# Altium footprint library Amirreza.PcbLib: 524 footprints (part 26 of 33)
Each footprint in its own frame and in the unit in brackets; x right, y up, seen from the top. Pads: shape width x height; smd on the part's side, far side on the other; paste and mask are expansions set on the pad; w line width, h text height; cw(c..) or ccw(c..) is an arc to the next point about the centre after c.
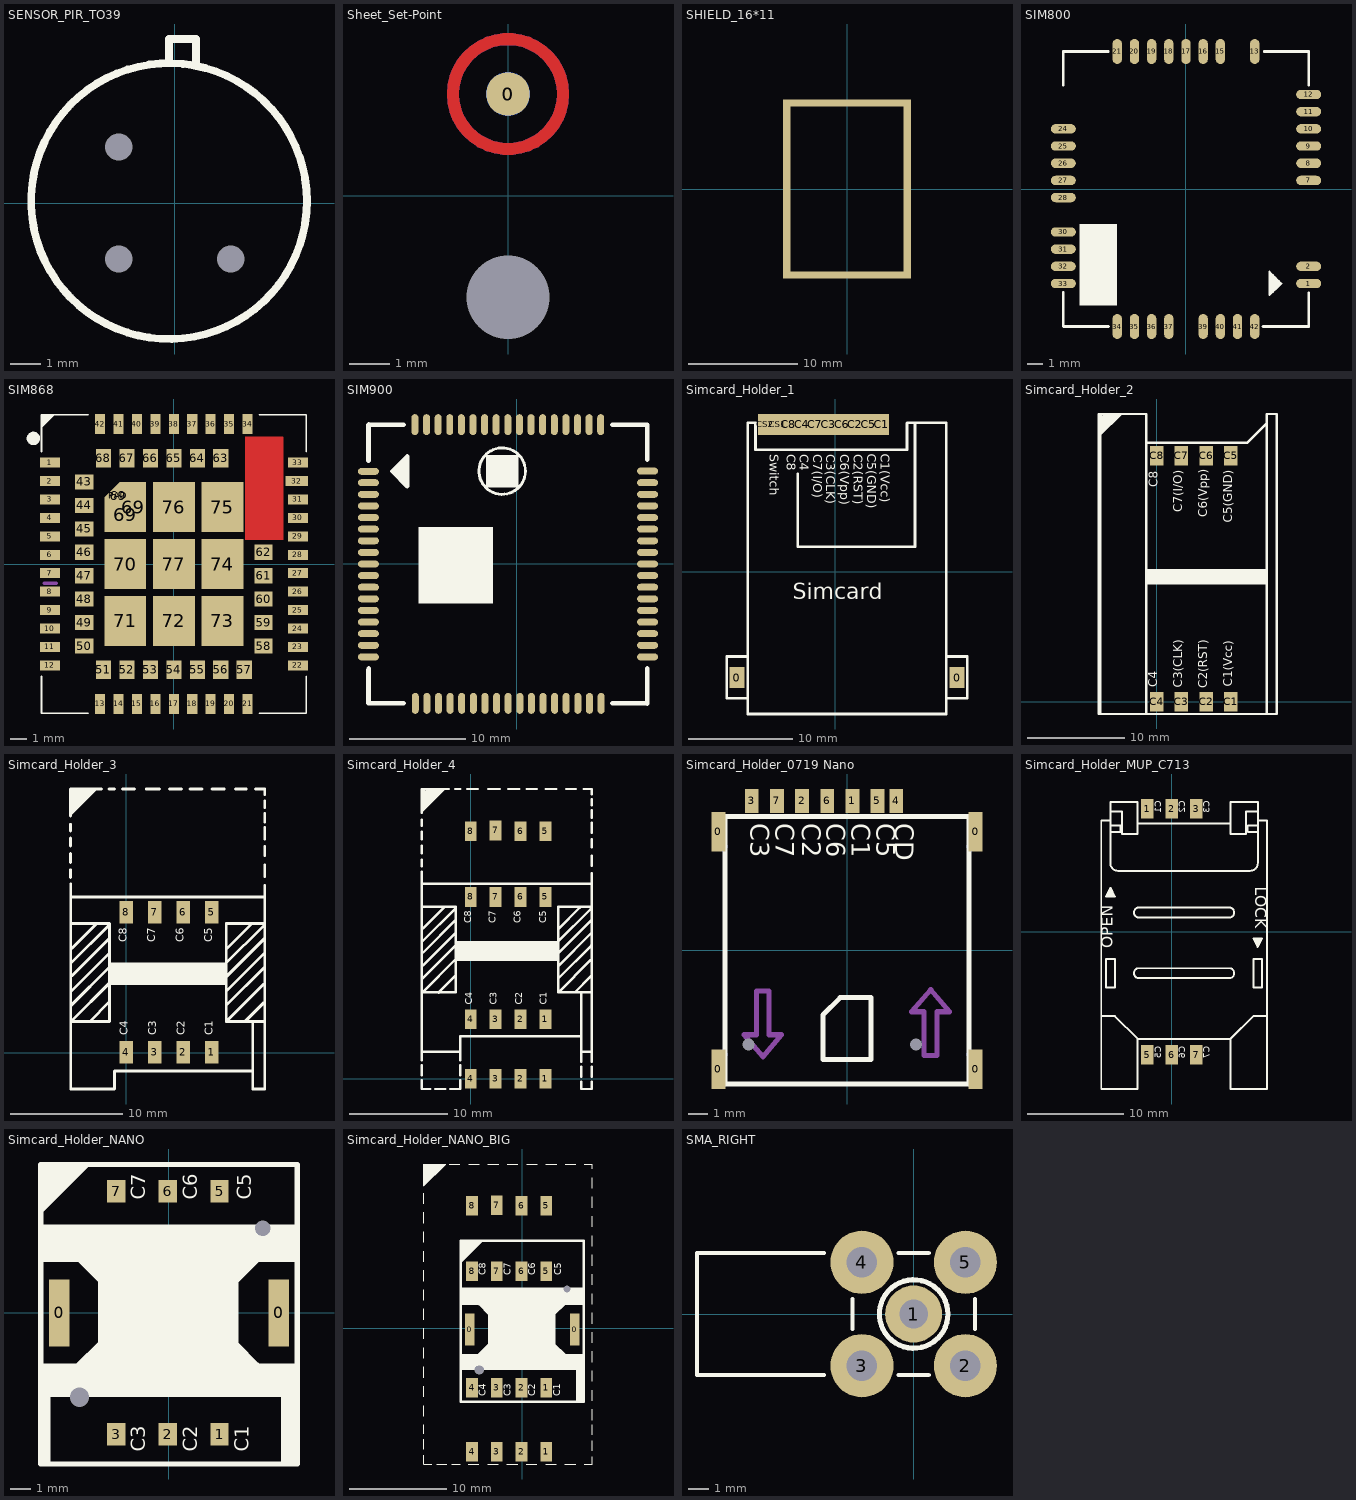
[diagram p25: the footprints below, top view; thin cyan lines are the x and y axes]

## SCRW_PANH_PHLIPS_M3X5 [mm] "SCREW, M3, 3.0mm diameter and 6.0mm PanHead, Phillips or Cross, 5mm Length"
3D body "Screw_M3x5.stp": height 2.28, standoff -5, extent -2.745,-2.745 2.745,2.745

## SENSOR_PIR_TO39 [mil]
pads (3):
  round 0 / inner round 0 / far side round 98.43 hole 35.43: 1(-72.5,72.5) 2(-72.5,-72.5) 3(72.5,-72.5)
Top Overlay:
  circle w10: c-7.5,2.5 r178.68
  lines w10: -7.5,182.5 -7.5,212.5 27.5,212.5 27.5,182.5
3D body "User Library-PIR_S_Orginal.step": height 187.04, standoff -76.74, extent -253.32,-253.33 253.34,253.34

## Sheet_Set-Point [mm]
pads (4):
  round 1.068 smd far side mask+0: 0(0,2.5)
  round 1.068 smd mask+0.65: 0(0,2.5)
  round 0 hole 2.05 paste-2539.97 mask-0.152: 1(0,-2.5)
  round 0 smd far side: 7(0.025,2.5)
Top Layer:
  circle w0.3: c0,2.5 r1.353
Bottom Layer:
  circle w0.3: c0,2.5 r1.353

## SHIELD_16*11 [mm]
pads (4):
  rect 0.65x16.4 smd: 1(-5.51,0) 1(5.51,0)
  rect 11.67x0.65 smd: 1(0,-7.875) 1(0,7.875)

## SIM800 [mm]
pads (33):
  oval 1.6x0.6 smd: 1(7.85,-6.05) 2(7.85,-4.95) 7(7.85,0.55) 8(7.85,1.65) 9(7.85,2.75) 10(7.85,3.85) 11(7.85,4.95) 12(7.85,6.05) 24(-7.85,3.85) 25(-7.85,2.75) 26(-7.85,1.65) 27(-7.85,0.55) 28(-7.85,-0.55) 30(-7.85,-2.75) 31(-7.85,-3.85) 32(-7.85,-4.95) 33(-7.85,-6.05)
  oval 0.6x1.6 smd: 13(4.4,8.8) 15(2.2,8.8) 16(1.1,8.8) 17(0,8.8) 18(-1.1,8.8) 19(-2.2,8.8) 20(-3.3,8.8) 21(-4.4,8.8) 34(-4.4,-8.8) 35(-3.3,-8.8) 36(-2.2,-8.8) 37(-1.1,-8.8) 39(1.1,-8.8) 40(2.2,-8.8) 41(3.3,-8.8) 42(4.4,-8.8)
Top Overlay:
  region: -4.415,-2.24 -6.803,-2.24 -6.803,-7.447 -4.415,-7.447
  lines w0.127: 5.412,-6.736 5.412,-5.364 ; 5.488,-6.66 5.488,-5.44 ; 5.564,-6.583 5.564,-5.517 ; 5.64,-6.507 5.64,-5.593 ; 5.716,-6.431 5.716,-5.669 ; 5.793,-6.355 5.793,-5.745 ; 5.869,-6.279 5.869,-5.821 ; 5.945,-6.202 5.945,-5.898 ; 6.021,-6.126 6.021,-5.974 ; 5.335,-6.787 6.097,-6.05 5.335,-5.288 5.335,-6.787
  lines w0.178: -7.85,-6.609 -7.85,-8.79 -7.84,-8.8 -4.952,-8.8 ; -7.85,6.65 -7.85,8.8 -4.977,8.8 ; 4.929,-8.8 7.85,-8.8 7.85,-6.634 ; 5.005,8.8 7.85,8.8 7.85,6.65
3D body "User Library-SIM800C-1.STEP": height 2.32, standoff -0.02, extent -7.85,-8.8 7.85,8.8

## SIM868 [mm]
pads (80):
  rect 1.2x0.6 smd mask+0.051: 1(-7.4,6.05) 2(-7.4,4.95) 3(-7.4,3.85) 4(-7.4,2.75) 5(-7.4,1.65) 6(-7.4,0.55) 7(-7.4,-0.55) 8(-7.4,-1.65) 9(-7.4,-2.75) 10(-7.4,-3.85) 11(-7.4,-4.95) 12(-7.4,-6.05) 22(7.4,-6.05) 23(7.4,-4.95) 24(7.4,-3.85) 25(7.4,-2.75) 26(7.4,-1.65) 27(7.4,-0.55) 28(7.4,0.55) 29(7.4,1.65) 30(7.4,2.75) 31(7.4,3.85) 33(7.4,6.05)
  rect 0.6x1.2 smd mask+0.051: 13(-4.4,-8.35) 14(-3.3,-8.35) 15(-2.2,-8.35) 16(-1.1,-8.35) 17(0,-8.35) 18(1.1,-8.35) 19(2.2,-8.35) 20(3.3,-8.35) 21(4.4,-8.35) 34(4.4,8.35) 35(3.3,8.35) 36(2.2,8.35) 37(1.1,8.35) 38(0,8.35) 39(-1.1,8.35) 40(-2.2,8.35) 41(-3.3,8.35) 42(-4.4,8.35)
  rect 1.35x0.6 smd paste+0.1 mask+0.051: 32(7.325,4.95)
  rect 1.1x0.9 smd paste-0.08 mask+0.051: 43(-5.35,4.9) 44(-5.35,3.5) 45(-5.35,2.1) 46(-5.35,0.7) 47(-5.35,-0.7) 48(-5.35,-2.1) 49(-5.35,-3.5) 50(-5.35,-4.9) 58(5.35,-4.9) 59(5.35,-3.5) 60(5.35,-2.1) 61(5.35,-0.7) 62(5.35,0.7)
  rect 0.9x1.1 smd paste-0.08 mask+0.051: 51(-4.2,-6.3) 52(-2.8,-6.3) 53(-1.4,-6.3) 54(0,-6.3) 55(1.4,-6.3) 56(2.8,-6.3) 57(4.2,-6.3) 63(2.8,6.3) 64(1.4,6.3) 65(0,6.3) 66(-1.4,6.3) 67(-2.8,6.3)
  rect 0.9x1.1 smd paste+0 mask+0.051: 68(-4.2,6.3)
  rect 1x1.2 smd rot 135 paste-10 mask+0.075: 69(-3.33,4.082)
  rect 2.5x2.07 smd paste-10 mask+0.075: 69(-2.9,2.935)
  rect 1.57x3 smd paste-10 mask+0.075: 69(-2.435,3.4)
  rect 2.5x3 smd paste-10 mask+0.075: 70(-2.9,0) 71(-2.9,-3.4) 72(0,-3.4) 73(2.9,-3.4) 74(2.9,0) 75(2.9,3.4) 76(0,3.4) 77(0,0)
  rect 1x1.32 smd rot 135 paste-10 mask+0: PAD(-3.33,4.082)
Top Layer:
  pour cut-out: 6.54,1.46 6.54,7.59 4.27,7.59 4.27,1.46
Top Overlay:
  circle w0.4: c-8.378,7.493 r0.2
  region: -7.9,8.1 -7.9,8.9 -7.1,8.9
  lines w0.1: -7.9,-6.7 -7.9,-8.9 -5.1,-8.9 ; -7.9,6.7 -7.9,8.9 -5.1,8.9 ; 5.1,-8.9 7.9,-8.9 7.9,-6.7 ; 5.1,8.9 7.9,8.9 7.9,6.7
Top Paste:
  region: -3.075,2.025 -3.075,3.225 -4.05,3.225 -4.05,2.025
  region: -1.75,2.025 -1.75,3.225 -2.725,3.225 -2.725,2.025
  region: -1.75,3.575 -1.75,4.775 -2.725,4.775 -2.725,3.575
  region: -3.075,-1.375 -3.075,-0.175 -4.05,-0.175 -4.05,-1.375
  region: -1.75,-1.375 -1.75,-0.175 -2.725,-0.175 -2.725,-1.375
  region: -1.75,0.175 -1.75,1.375 -2.725,1.375 -2.725,0.175
  region: -3.075,0.175 -3.075,1.375 -4.05,1.375 -4.05,0.175
  region: -0.175,2.025 -0.175,3.225 -1.15,3.225 -1.15,2.025
  region: 1.15,2.025 1.15,3.225 0.175,3.225 0.175,2.025
  region: 1.15,3.575 1.15,4.775 0.175,4.775 0.175,3.575
  region: -0.175,3.575 -0.175,4.775 -1.15,4.775 -1.15,3.575
  region: -0.175,-1.375 -0.175,-0.175 -1.15,-0.175 -1.15,-1.375
  region: 1.15,-1.375 1.15,-0.175 0.175,-0.175 0.175,-1.375
  region: 1.15,0.175 1.15,1.375 0.175,1.375 0.175,0.175
  region: -0.175,0.175 -0.175,1.375 -1.15,1.375 -1.15,0.175
  region: 2.725,2.025 2.725,3.225 1.75,3.225 1.75,2.025
  region: 4.075,2.025 4.075,3.225 3.1,3.225 3.1,2.025
  region: 4.075,3.575 4.075,4.775 3.1,4.775 3.1,3.575
  region: 2.725,3.575 2.725,4.775 1.75,4.775 1.75,3.575
  region: 2.725,-1.375 2.725,-0.175 1.75,-0.175 1.75,-1.375
  region: 4.075,-1.375 4.075,-0.175 3.1,-0.175 3.1,-1.375
  region: 4.075,0.175 4.075,1.375 3.1,1.375 3.1,0.175
  region: 2.725,0.175 2.725,1.375 1.75,1.375 1.75,0.175
  region: 2.725,-4.775 2.725,-3.575 1.75,-3.575 1.75,-4.775
  region: 4.075,-4.775 4.075,-3.575 3.1,-3.575 3.1,-4.775
  region: 4.075,-3.225 4.075,-2.025 3.1,-2.025 3.1,-3.225
  region: 2.725,-3.225 2.725,-2.025 1.75,-2.025 1.75,-3.225
  region: -0.175,-4.775 -0.175,-3.575 -1.15,-3.575 -1.15,-4.775
  region: 1.15,-4.775 1.15,-3.575 0.175,-3.575 0.175,-4.775
  region: 1.15,-3.225 1.15,-2.025 0.175,-2.025 0.175,-3.225
  region: -0.175,-3.225 -0.175,-2.025 -1.15,-2.025 -1.15,-3.225
  region: -3.075,-3.225 -3.075,-2.025 -4.05,-2.025 -4.05,-3.225
  region: -1.75,-3.225 -1.75,-2.025 -2.725,-2.025 -2.725,-3.225
  region: -1.75,-4.775 -1.75,-3.575 -2.725,-3.575 -2.725,-4.775
  region: -3.075,-4.775 -3.075,-3.575 -4.05,-3.575 -4.05,-4.775
  region: -3.075,3.575 -4.05,3.575 -4.05,3.875 -3.175,4.75 -3.075,4.75
Mechanical 2:
  lines w0.203: -7.748,-1.142 -7.003,-1.142
3D body "User Library-SIM868-1 (2).step": height 2.5, standoff 0, extent -7.85,-8.8 7.85,8.8

## SIM900 [mm]
pads (68):
  oval 1.8x0.6 smd mask+0.102: 1(-12.778,7.974) 2(-12.778,6.993) 3(-12.778,5.993) 4(-12.778,4.993) 5(-12.778,3.993) 6(-12.778,2.993) 7(-12.778,1.993) 8(-12.778,0.993) 9(-12.778,-0.007) 10(-12.778,-1.007) 11(-12.778,-2.007) 12(-12.778,-3.007) 13(-12.778,-4.007) 14(-12.778,-5.007) 15(-12.778,-6.007) 16(-12.778,-7.007) 17(-12.778,-8.007) 35(11.254,-8.007) 36(11.254,-7.007) 37(11.254,-6.007) 38(11.254,-5.007) 39(11.254,-4.007) 40(11.254,-3.007) 41(11.254,-2.007) 42(11.254,-1.007) 43(11.254,-0.007) 44(11.254,0.993) 45(11.254,1.987) 46(11.254,2.993) 47(11.254,3.993) 48(11.254,4.993) 49(11.254,5.993) 50(11.254,6.993) 51(11.254,7.993)
  oval 0.6x1.8 smd mask+0.102: 18(-8.747,-12.007) 19(-7.746,-12.007) 20(-6.747,-12.007) 21(-5.747,-12.007) 22(-4.747,-12.007) 23(-3.746,-12.007) 24(-2.746,-12.007) 25(-1.747,-12.007) 26(-0.747,-12.007) 27(0.253,-12.007) 28(1.254,-12.007) 29(2.253,-12.007) 30(3.253,-12.007) 31(4.248,-12.007) 32(5.253,-12.007) 33(6.254,-12.007) 34(7.254,-12.007) 52(7.222,11.993) 53(6.222,11.993) 54(5.222,11.993) 55(4.222,11.993) 56(3.222,11.993) 57(2.222,11.993) 58(1.222,11.993) 59(0.222,11.993) 60(-0.778,11.993) 61(-1.778,11.993) 62(-2.778,11.993) 63(-3.778,11.993) 64(-4.778,11.993) 65(-5.778,11.993) 66(-6.778,11.993) 67(-7.778,11.993) 68(-8.778,11.993)
Top Layer:
  lines w0.4: 11.238,-0.991 11.254,-1.007
Top Overlay:
  circle w0.254: c-1.262,7.993 r2
  rectangle: -2.662,6.593 0.138,9.393
  rectangle: -8.462,-3.407 -2.062,3.193
  lines w0.4: -12.778,-9.107 -12.778,-12.007 -9.762,-12.007 ; -12.778,8.893 -12.778,11.993 -9.762,11.993 -12.746,11.993 ; -12.762,-11.991 -12.762,-9.007 ; -12.762,8.993 -12.762,12.009 ; -10.195,7.467 -10.195,8.433 ; -9.808,7.092 -9.808,8.87 ; -9.433,7.975 -10.703,7.975 ; 8.238,-12.007 11.222,-12.007 11.222,-9.107 ; 11.222,9.093 11.222,11.993 ; 11.238,-12.022 11.238,-9.007 ; 11.238,8.993 11.238,11.959 11.203,11.993 ; -10.703,7.975 -9.433,9.245 -9.433,6.705 -10.703,7.975 ; 11.203,11.993 8.238,11.993 11.204,11.993 ; -8.047,-2.807 -8.047,2.793 -2.447,2.793 -2.447,-2.807 -8.047,-2.807

## Simcard_Holder_1 [mm]
pads (12):
  rect 1.4x2 smd: 0(-9.407,-10.114) 0(11.643,-10.114) C1(4.449,14.111) C2(1.909,14.111) C3(-0.621,14.111) C4(-3.171,14.111) C5(3.179,14.111) C6(0.651,14.111) C7(-1.901,14.111) C8(-4.441,14.111) CS1(-5.512,14.111) CS2(-6.712,14.111)
Top Overlay:
  lines w0.254: -8.382,-12.089 -10.382,-12.089 -10.382,-8.089 -8.382,-8.089 ; -3.582,9.384 -3.582,2.411 7.618,2.411 7.618,5.911 ; 6.851,14.244 6.851,11.684 -7.632,11.684 -7.632,14.261 -8.382,14.261 -8.382,-13.589 10.618,-13.589 10.618,14.261 6.868,14.261 ; 7.618,5.411 7.618,14.261 ; 10.618,-12.089 12.618,-12.089 12.618,-8.089 10.618,-8.089
  text "Switch" at -6.589,11.259 h1.52
  text "C8" at -4.989,11.284 h1.52
  text "C1(Vcc)" at 4.018,11.311 h1.52
  text "C5(GND)" at 2.718,11.286 h1.52
  text "C2(RST)" at 1.411,11.284 h1.52
  text "C6(Vpp)" at 0.136,11.284 h1.52
  text "C3(CLK)" at -1.189,11.284 h1.52
  text "C7(I/O)" at -2.464,11.284 h1.52
  text "C4" at -3.739,11.284 h1.52
  text "Simcard" at -4.082,-2.589 h1.52

## Simcard_Holder_2 [mm]
pads (8):
  rect 1.4x2 smd: C1(7.62,0) C2(5.08,0) C3(2.54,0) C4(0,0) C5(7.62,25.22) C6(5.08,25.22) C7(2.54,25.22) C8(0,25.22)
Top Overlay:
  rectangle: -1.067,12 11.278,13.62
  region: -5.763,27.765 -4.153,29.346 -4.394,29.591 -6.004,28.01
  region: -5.823,29.071 -5.539,29.349 -5.78,29.595 -6.064,29.316
  region: -5.817,28.683 -5.143,29.346 -5.383,29.591 -6.058,28.928
  region: -5.835,28.346 -4.826,29.337 -5.067,29.582 -6.076,28.591
  region: -5.787,28.069 -4.47,29.362 -4.711,29.608 -6.028,28.314
  region: -5.805,27.426 -3.876,29.322 -4.117,29.567 -6.046,27.672
  lines w0.254: -5.761,-1.219 -5.761,27.437 -3.721,29.477 ; -1.067,-1.27 -1.067,29.515 -5.96,29.515 -5.96,-1.27 12.34,-1.27 12.34,29.515 11.278,29.515 11.278,-1.27 ; -1.067,26.543 9.271,26.543 11.278,28.55 ; -5.96,26.568 -5.96,26.568
  text "C4" at 0.356,1.499 h1.52
  text "C7(I/O)" at 2.946,19.431 h1.52
  text "C3(CLK)" at 2.921,1.448 h1.52
  text "C6(Vpp)" at 5.512,18.923 h1.52
  text "C2(RST)" at 5.512,1.372 h1.52
  text "C5(GND)" at 8.052,18.364 h1.52
  text "C1(Vcc)" at 8.052,1.524 h1.52
  text "C8" at 0.432,22.022 h1.52

## Simcard_Holder_3 [mm]
pads (8):
  rect 1.2x2 smd: 1(7.62,0.058) 2(5.08,0.058) 3(2.54,0.058) 4(0,0.058) 5(7.62,12.527) 6(5.08,12.527) 7(2.54,12.527) 8(0,12.527)
Top Overlay:
  rectangle: -1.499,6.027 8.915,8.027
  region: -4.84,21.435 -2.911,23.331 -3.152,23.576 -5.081,21.681
  region: -4.822,22.078 -3.505,23.371 -3.746,23.617 -5.063,22.323
  region: -4.869,22.355 -3.861,23.346 -4.102,23.591 -5.11,22.6
  region: -4.852,22.692 -4.177,23.355 -4.418,23.6 -5.093,22.937
  region: -4.858,23.08 -4.574,23.358 -4.815,23.604 -5.099,23.325
  region: -4.797,21.774 -3.188,23.355 -3.429,23.6 -5.038,22.019
  lines w0.254: -4.975,23.527 -2.21,23.527 ; -4.969,15.633 -4.969,16.319 ; -4.969,16.98 -4.969,17.767 ; -4.969,18.427 -4.969,19.164 ; -4.969,19.774 -4.969,20.383 ; -4.969,21.12 -4.969,23.527 ; -4.96,15.075 -4.96,13.897 ; -4.936,7.996 -1.562,11.37 ; -4.936,21.306 -2.756,23.486 ; -4.928,2.797 -1.499,2.797 -1.499,11.535 -4.877,11.535 ; -4.91,4.237 -1.499,7.649 ; -4.86,2.865 -1.575,6.15 ; -4.86,5.558 -1.511,8.906 ; -4.86,9.317 -2.68,11.497 ; -4.834,6.879 -1.499,10.214 ; -3.259,2.789 -1.537,4.512 ; -1.549,23.527 -1.067,23.527 ; -1.067,-3.235 -1.067,-1.642 11.278,-1.642 ; -1.067,-3.232 -4.96,-3.232 -4.96,13.897 ; -0.356,23.527 0.711,23.527 ; 1.778,23.527 2.946,23.527 ; 3.835,23.527 4.928,23.527 ; 5.69,23.527 6.756,23.527 ; 7.645,23.527 8.738,23.527 ; 8.856,7.945 12.23,11.319 ; 8.933,2.815 12.217,6.099 ; 8.933,5.507 12.281,8.855 ; 8.933,9.266 11.112,11.446 ; 8.941,4.245 12.294,7.598 ; 8.958,6.828 12.294,10.163 ; 9.728,23.527 10.693,23.527 ; 10.604,2.81 12.255,4.461 ; 11.278,2.797 11.278,-3.232 12.34,-3.232 12.34,13.897 ; 11.532,23.527 12.319,23.527 ; 12.294,11.535 8.915,11.535 8.915,2.797 12.34,2.797 ; 12.34,14.943 12.34,13.897 ; 12.34,15.73 12.34,16.746 ; 12.34,17.585 12.34,18.397 ; 12.34,19.058 12.34,20.099 ; 12.34,20.582 12.34,21.344 ; 12.34,21.852 12.34,22.461 ; 12.34,23.016 12.34,23.527 ; -4.96,13.897 12.34,13.897
  text "C2" at 5.498,1.544 h1.2
  text "C1" at 7.987,1.544 h1.2
  text "C3" at 2.932,1.544 h1.2
  text "C4" at 0.392,1.544 h1.2
  text "C5" at 7.936,9.862 h1.2
  text "C6" at 5.371,9.868 h1.2
  text "C7" at 2.831,9.868 h1.2
  text "C8" at 0.291,9.865 h1.2

## Simcard_Holder_4 [mm]
pads (16):
  rect 1.2x2 smd: 1(7.62,0) 1(7.62,6.053) 2(5.08,0) 2(5.08,6.053) 3(2.54,0) 3(2.54,6.053) 4(0,0) 4(0,6.053) 5(7.62,18.522) 5(7.62,25.22) 6(5.08,18.522) 6(5.08,25.22) 7(2.54,18.522) 7(2.54,25.298) 8(0,18.522) 8(0,25.22)
Top Overlay:
  region: -4.797,27.768 -3.188,29.349 -3.429,29.594 -5.038,28.013
  region: -4.858,29.074 -4.574,29.353 -4.815,29.598 -5.099,29.319
  region: -4.852,28.687 -4.177,29.349 -4.418,29.594 -5.093,28.932
  region: -4.869,28.349 -3.861,29.34 -4.102,29.586 -5.11,28.594
  region: -4.822,28.072 -3.505,29.366 -3.746,29.611 -5.063,28.317
  region: -4.84,27.43 -2.911,29.325 -3.152,29.57 -5.081,27.675
  rectangle: -1.499,12.022 8.915,14.022
  lines w0.254: -4.975,29.522 -2.21,29.522 ; -4.969,21.628 -4.969,22.314 ; -4.969,22.974 -4.969,23.761 ; -4.969,24.422 -4.969,25.158 ; -4.969,25.768 -4.969,26.378 ; -4.969,27.114 -4.969,29.522 ; -4.96,-0.159 -4.96,-1.041 -4.115,-1.041 ; -4.96,0.349 -4.96,1.365 ; -4.96,1.873 -4.96,2.763 ; -4.96,21.069 -4.96,19.892 ; -4.936,13.991 -1.562,17.364 ; -4.936,27.3 -2.756,29.48 ; -4.928,8.792 -1.499,8.792 -1.499,17.529 -4.877,17.529 ; -4.91,10.231 -1.499,13.643 ; -4.86,8.86 -1.575,12.145 ; -4.86,11.552 -1.511,14.9 ; -4.86,15.311 -2.68,17.491 ; -4.834,12.873 -1.499,16.209 ; -3.607,-1.041 -2.591,-1.041 ; -3.259,8.784 -1.537,10.506 ; -2.083,-1.041 -1.067,-1.041 -1.067,-0.159 ; -1.549,29.522 -1.067,29.522 ; -1.067,0.349 -1.067,1.365 ; -1.067,1.873 -1.067,2.763 -4.96,2.763 ; -1.067,2.759 -1.067,4.352 11.278,4.352 ; -0.356,29.522 0.711,29.522 ; 1.778,29.522 2.946,29.522 ; 3.835,29.522 4.928,29.522 ; 5.69,29.522 6.756,29.522 ; 7.645,29.522 8.738,29.522 ; 8.856,13.94 12.23,17.313 ; 8.933,8.809 12.217,12.094 ; 8.933,11.501 12.281,14.85 ; 8.933,15.261 11.112,17.44 ; 8.941,10.24 12.294,13.592 ; 8.958,12.822 12.294,16.158 ; 9.728,29.522 10.693,29.522 ; 10.604,8.804 12.255,10.455 ; 11.278,-0.285 11.278,-1.041 12.34,-1.041 12.34,-0.285 ; 11.278,0.223 11.278,1.239 ; 11.278,1.747 11.278,2.763 ; 11.278,8.792 11.278,2.763 ; 11.532,29.522 12.319,29.522 ; 12.294,17.529 8.915,17.529 8.915,8.792 12.34,8.792 ; 12.34,0.223 12.34,1.239 ; 12.34,1.747 12.34,2.763 ; 12.34,20.937 12.34,19.892 ; 12.34,21.725 12.34,22.741 ; 12.34,23.579 12.34,24.392 ; 12.34,25.052 12.34,26.094 ; 12.34,26.576 12.34,27.338 ; 12.34,27.846 12.34,28.456 ; 12.34,29.01 12.34,29.522 ; -4.96,2.763 -4.96,19.892 ; -4.96,19.892 12.34,19.892 ; 11.278,2.763 12.34,2.763 ; 12.34,2.763 12.34,19.892
  text "C8" at 0.291,15.86 h1.2
  text "C7" at 2.831,15.862 h1.2
  text "C6" at 5.371,15.862 h1.2
  text "C5" at 7.936,15.856 h1.2
  text "C4" at 0.392,7.539 h1.2
  text "C3" at 2.932,7.539 h1.2
  text "C1" at 7.987,7.539 h1.2
  text "C2" at 5.498,7.539 h1.2

## Simcard_Holder_0719 Nano [mm] "Nano-SIM Card Holder Push-push Type 7PIN-0719-1.35"
pads (13):
  rect 0.7x2 smd: 0(-6.498,-6) 0(-6.498,6) 0(6.498,-6) 0(6.498,6)
  rect 0.7x1.2 smd: 1(0.27,7.55) 2(-2.27,7.55) 3(-4.81,7.55) 4(2.49,7.55) 5(1.54,7.55) 6(-1,7.55) 7(-3.54,7.55)
  round 0 hole 0.6 unplated: ""(-4.98,-4.75) ""(3.49,-4.75)
Top Overlay:
  lines w0.254: -6.15,-6.75 -6.15,6.75 6.15,6.75 6.15,-6.75 -6.15,-6.75 ; -1.219,-5.512 1.206,-5.512 1.206,-2.388 -0.343,-2.388 -1.219,-3.264 -1.219,-5.512
  text "C2" at -2.594,6.433 h1.6
  text "C1" at -0.079,6.433 h1.6
  text "C3" at -5.185,6.433 h1.6
  text "C5" at 1.168,6.433 h1.6
  text "C6" at -1.349,6.433 h1.6
  text "C7" at -3.915,6.433 h1.6
  text "CD" at 2.118,6.433 h1.6
Mechanical 13:
  region: 6.53,6.75 6.15,6.75 6.15,5.25 6.53,5.25
  rectangle: -6.53,5.25 -6.15,6.75
  rectangle: -6.53,-6.75 -6.15,-5.25
  region: 6.53,-5.25 6.15,-5.25 6.15,-6.75 6.53,-6.75
  lines w0.254: -6.15,-6.75 -6.53,-6.75 -6.53,-5.25 -6.15,-5.25 ; -6.15,5.25 -6.53,5.25 -6.53,6.75 -6.15,6.75 ; 6.15,-6.75 6.53,-6.75 6.53,-5.25 6.15,-5.25 ; 6.15,5.25 6.53,5.25 6.53,6.75 6.15,6.75 ; -5.207,-4.261 -4.572,-4.261 -4.572,-2.051 -3.937,-2.051 -3.937,-4.261 -3.302,-4.261 -4.242,-5.379 -5.207,-4.261 ; 3.264,-3.099 3.899,-3.099 3.899,-5.309 4.534,-5.309 4.534,-3.099 5.169,-3.099 4.229,-1.981 3.264,-3.099
Mechanical 29:
  text "EJECT" at -2.267,-4.804 h1.2
  text "INSERT" at 2.761,-4.804 h1.2
3D body "xb-xknano-113.stp": height 1.37, standoff -0.4, extent -6.549,-6.823 6.541,7.757

## Simcard_Holder_MUP_C713 [mm]
pads (6):
  rect 1.3x2 smd: 1(-2.54,12.77) 2(0,12.77) 3(2.54,12.77) 5(-2.54,-12.77) 6(0,-12.77) 7(2.54,-12.77)
Top Overlay:
  region: 8.913,-1.587 9.362,-0.689 8.464,-0.689
  region: -6.373,4.576 -6.822,3.678 -5.924,3.678
  lines w0.203: -7.33,-8.749 -5.924,-8.749 -3.552,-11.121 ; -6.386,10.383 -5.344,10.383 -5.344,11.058 -6.386,11.058 ; -6.386,12.507 -5.161,12.507 -5.161,10.139 -3.552,10.139 -3.552,11.25 ; 8.926,10.383 7.884,10.383 7.884,11.058 8.926,11.058 ; 8.926,12.507 7.701,12.507 7.701,10.139 6.092,10.139 6.092,11.25 ; 9.87,-8.749 8.464,-8.749 6.092,-11.121 ; -6.386,11.555 -6.386,13.46 -3.552,13.46 -3.552,11.25 ; -6.386,11.555 -7.33,11.555 -7.33,-16.323 -3.552,-16.323 -3.552,-11.121 ; -6.386,11.555 -6.386,7.125 ccw(c-5.598,7.125) -5.598,6.337 8.138,6.337 ccw(c8.138,7.125) 8.926,7.125 8.926,11.555 ; -3.552,-11.121 6.092,-11.121 ; -3.552,11.25 6.092,11.25 ; 6.092,-11.121 6.092,-16.323 9.87,-16.323 9.87,11.555 8.926,11.555 ; 6.092,11.25 6.092,13.46 8.926,13.46 8.926,11.555 ; -6.822,-5.782 -6.822,-2.803 -5.924,-2.803 -5.924,-5.782 -6.822,-5.782 ; -6.822,3.678 -6.373,4.576 -5.924,3.678 -6.822,3.678 ; -3.552,-4.8 cw(c-3.41,-4.292) -3.552,-3.784 6.092,-3.784 cw(c5.95,-4.292) 6.092,-4.8 -3.552,-4.8 ; -3.552,1.492 cw(c-3.41,2) -3.552,2.508 6.092,2.508 cw(c5.95,2) 6.092,1.492 -3.552,1.492 ; 8.464,-5.782 8.464,-2.803 9.362,-2.803 9.362,-5.782 8.464,-5.782 ; 8.464,-0.689 8.913,-1.587 9.362,-0.689 8.464,-0.689
  text "LOCK" at 8.272,4.662 h2
  text "OPEN" at -5.732,-1.723 h2
  text "C7" at 4.216,-11.908 h1.2
  text "C6" at 1.676,-11.908 h1.2
  text "C5" at -0.864,-11.908 h1.2
  text "C3" at 4.216,13.632 h1.2
  text "C2" at 1.676,13.632 h1.2
  text "C1" at -0.864,13.632 h1.2
3D body "User Library-SIM holder 115B-AAA0-R.step": height 2.4, standoff -0.65, extent -7.33,-16.425 9.87,13.275

## Simcard_Holder_NANO [mm]
pads (10):
  rect 1x3.29 smd: 0(-5.385,-0.005) 0(5.385,-0.005)
  round 0 hole 0.95: 0(-4.395,-4.155)
  round 0 hole 0.75: 0(4.605,4.145)
  rect 0.9x1.1 smd: 1(2.485,-5.975) 2(-0.055,-5.975) 3(-2.595,-5.975) 5(2.485,5.975) 6(-0.055,5.975) 7(-2.595,5.975)
Top Overlay:
  rectangle: 5.512,-7.433 6.303,-3.75
  rectangle: -6.304,-7.433 -5.821,-3.877
  region: 2.967,2.169 3.456,1.717 4.364,2.702 3.875,3.153
  region: 3.247,-1.59 2.796,-2.079 3.78,-2.988 4.232,-2.499
  region: -4.297,-2.505 -3.852,-2.95 -3.044,-2.141 -3.489,-1.697
  region: -3.915,3.16 -4.439,2.592 -3.455,1.684 -2.931,2.251
  rectangle: -6.278,-4.131 6.303,-2.505
  rectangle: -6.278,2.499 6.303,4.327
  rectangle: -3.484,-3.039 3.425,2.753
  region: -6.3,7.305 -6.3,4.845 -3.841,7.305
  lines w0.254: -4.538,-2.67 -3.332,-1.464 -3.332,-0.6 ; -4.398,2.854 -4.398,2.6 -3.332,1.533 -3.332,0.746 ; -1.966,7.28 -6.303,7.28 -6.303,-7.433 6.303,-7.433 6.303,7.28 -1.958,7.28 ; 3.298,-0.753 3.298,-1.54 4.339,-2.581 ; 3.298,0.416 3.298,1.559 4.377,2.638 4.377,2.842
  text "C7" at -0.919,5.538 h1.2
  text "C6" at 1.621,5.538 h1.2
  text "C5" at 4.288,5.538 h1.2
  text "C3" at -0.919,-6.837 h1.2
  text "C1" at 4.161,-6.837 h1.2
  text "C2" at 1.621,-6.837 h1.2
3D body "User Library-nano sim.step": height 1.45, standoff 0.1, extent -5.03,-6.185 5.37,6.115

## Simcard_Holder_NANO_BIG [mm]
pads (20):
  rect 1x3.29 smd: 0(-5.385,-0.107) 0(5.385,-0.107)
  round 0 hole 0.95: 0(-4.395,-4.257)
  round 0 hole 0.75: 0(4.605,4.043)
  rect 1.2x2 smd: 1(2.485,-12.649) 1(2.485,-6.077) 2(-0.055,-12.649) 2(-0.055,-6.077) 3(-2.595,-12.649) 3(-2.595,-6.077) 4(-5.135,-12.649) 4(-5.135,-6.077) 5(2.485,5.873) 5(2.485,12.571) 6(-0.055,5.873) 6(-0.055,12.571) 7(-2.595,5.873) 7(-2.595,12.649) 8(-5.135,5.873) 8(-5.135,12.571)
Top Overlay:
  rectangle: -3.484,-3.141 3.425,2.65
  rectangle: -6.278,2.396 6.303,4.225
  rectangle: -6.278,-4.233 6.303,-2.608
  region: -3.915,3.057 -4.439,2.49 -3.455,1.581 -2.931,2.149
  region: -4.297,-2.608 -3.852,-3.052 -3.044,-2.244 -3.489,-1.799
  region: 3.247,-1.693 2.796,-2.182 3.78,-3.09 4.232,-2.601
  region: 2.967,2.066 3.456,1.615 4.364,2.599 3.875,3.051
  rectangle: 5.512,-7.535 6.303,-3.852
  region: -4.119,9.017 -6.303,6.833 -6.303,9.017
  region: -7.92,16.873 -10.104,14.688 -10.104,16.873
  lines w0.127: -10.095,-13.018 -10.095,-13.9 -9.25,-13.9 ; -10.095,-12.401 -10.095,-11.385 ; -10.095,-10.777 -10.095,-9.887 ; -10.095,-8.998 -10.095,-7.905 ; -10.095,-7.016 -10.095,-5.924 ; -10.095,-5.035 -10.095,-3.943 ; -10.095,-3.054 -10.095,-1.962 ; -10.095,-1.073 -10.095,0.019 ; -10.095,0.908 -10.095,2.001 ; -10.095,2.89 -10.095,3.982 ; -10.095,4.871 -10.095,5.963 ; -10.095,6.852 -10.095,7.944 ; -10.095,8.833 -10.095,9.925 ; -10.095,10.814 -10.095,11.907 ; -10.095,12.796 -10.095,13.888 ; -8.742,-13.9 -7.726,-13.9 ; -7.472,16.873 -6.38,16.873 ; -7.218,-13.9 -6.367,-13.9 ; -5.521,-13.9 -4.429,-13.9 ; -5.491,16.873 -4.398,16.873 ; -3.54,-13.9 -2.447,-13.9 ; -3.509,16.873 -2.417,16.873 ; -1.558,-13.9 -0.466,-13.9 ; -1.528,16.873 -0.436,16.873 ; 0.423,-13.9 1.515,-13.9 ; 0.453,16.873 1.545,16.873 ; 2.404,-13.9 3.496,-13.9 ; 2.434,16.873 3.526,16.873 ; 4.385,-13.9 5.477,-13.9 ; 4.415,16.873 5.508,16.873 ; 6.366,-13.9 7.205,-13.9 7.205,-13.144 ; 6.397,16.873 7.184,16.873 ; 7.205,-12.527 7.205,-11.511 ; 7.205,-10.903 7.205,-9.887 ; 7.205,-9.395 7.205,-8.302 ; 7.205,-7.413 7.205,-6.321 ; 7.205,-5.432 7.205,-4.34 ; 7.205,-3.451 7.205,-2.359 ; 7.205,-1.47 7.205,-0.378 ; 7.205,0.511 7.205,1.604 ; 7.205,2.493 7.205,3.585 ; 7.205,4.474 7.205,5.566 ; 7.205,6.455 7.205,7.547 ; 7.205,8.436 7.205,9.528 ; 7.205,10.417 7.205,11.51 ; 7.205,12.399 7.205,13.491 ; 7.205,14.38 7.205,15.472 ; 7.205,16.361 7.205,16.873 ; -10.104,14.617 -7.849,16.873 -10.104,16.873 -10.104,14.617
  lines w0.254: -4.538,-2.773 -3.332,-1.566 -3.332,-0.703 ; -4.398,2.752 -4.398,2.498 -3.332,1.431 -3.332,0.644 ; -4.068,9.017 -6.304,9.017 -6.303,6.833 ; 3.298,-0.855 3.298,-1.642 4.339,-2.684 ; 3.298,0.313 3.298,1.456 4.377,2.536 4.377,2.739 ; -6.303,6.833 -6.303,-7.535 6.303,-7.535 6.303,9.017 -4.119,9.017 -6.304,6.833
  text "C8" at -3.459,5.436 h1.2
  text "C7" at -0.919,5.436 h1.2
  text "C6" at 1.621,5.436 h1.2
  text "C5" at 4.288,5.436 h1.2
  text "C4" at -3.459,-6.939 h1.2
  text "C3" at -0.919,-6.939 h1.2
  text "C1" at 4.161,-6.939 h1.2
  text "C2" at 1.621,-6.939 h1.2
3D body "User Library-nano sim.step": height 1.45, standoff 0.1, extent -5.03,-6.287 5.37,6.013

## SMA_RIGHT [mm] "Center1.5mm_sheild1.8mm"
pads (5):
  round 2.8 hole 1.4: 1(0,0)
  round 3.1 hole 1.5: 2(2.54,-2.54) 3(-2.54,-2.54) 4(-2.54,2.54) 5(2.54,2.54)
Top Overlay:
  circle w0.254: c0,0 r1.681
  lines w0.2: -3,-0.74 -3,0.74 ; -0.74,-3 0.74,-3 ; -0.74,3 0.74,3 ; 3,-0.74 3,0.74
  lines w0.203: -4.405,-3 -10.637,-3 -10.637,3 -4.405,3
Bottom Overlay:
  circle w0.254: c0,0 r1.681
3D body "User Library-Antenna AP22A.step": height 10.75, standoff 1.25, extent -56.69,-4.598 -5.689,4.902
3D body "63011002124501.stp": height 9.5, standoff -4.1, extent -12.256,-3.5 3.446,3.5